# Altium footprint library Phoenix.PcbLib: 54 footprints (part 2 of 4)
Each footprint in its own frame and in the unit in brackets; x right, y up, seen from the top. Pads: shape width x height; smd on the part's side, far side on the other; paste and mask are expansions set on the pad; w line width, h text height; cw(c..) or ccw(c..) is an arc to the next point about the centre after c.
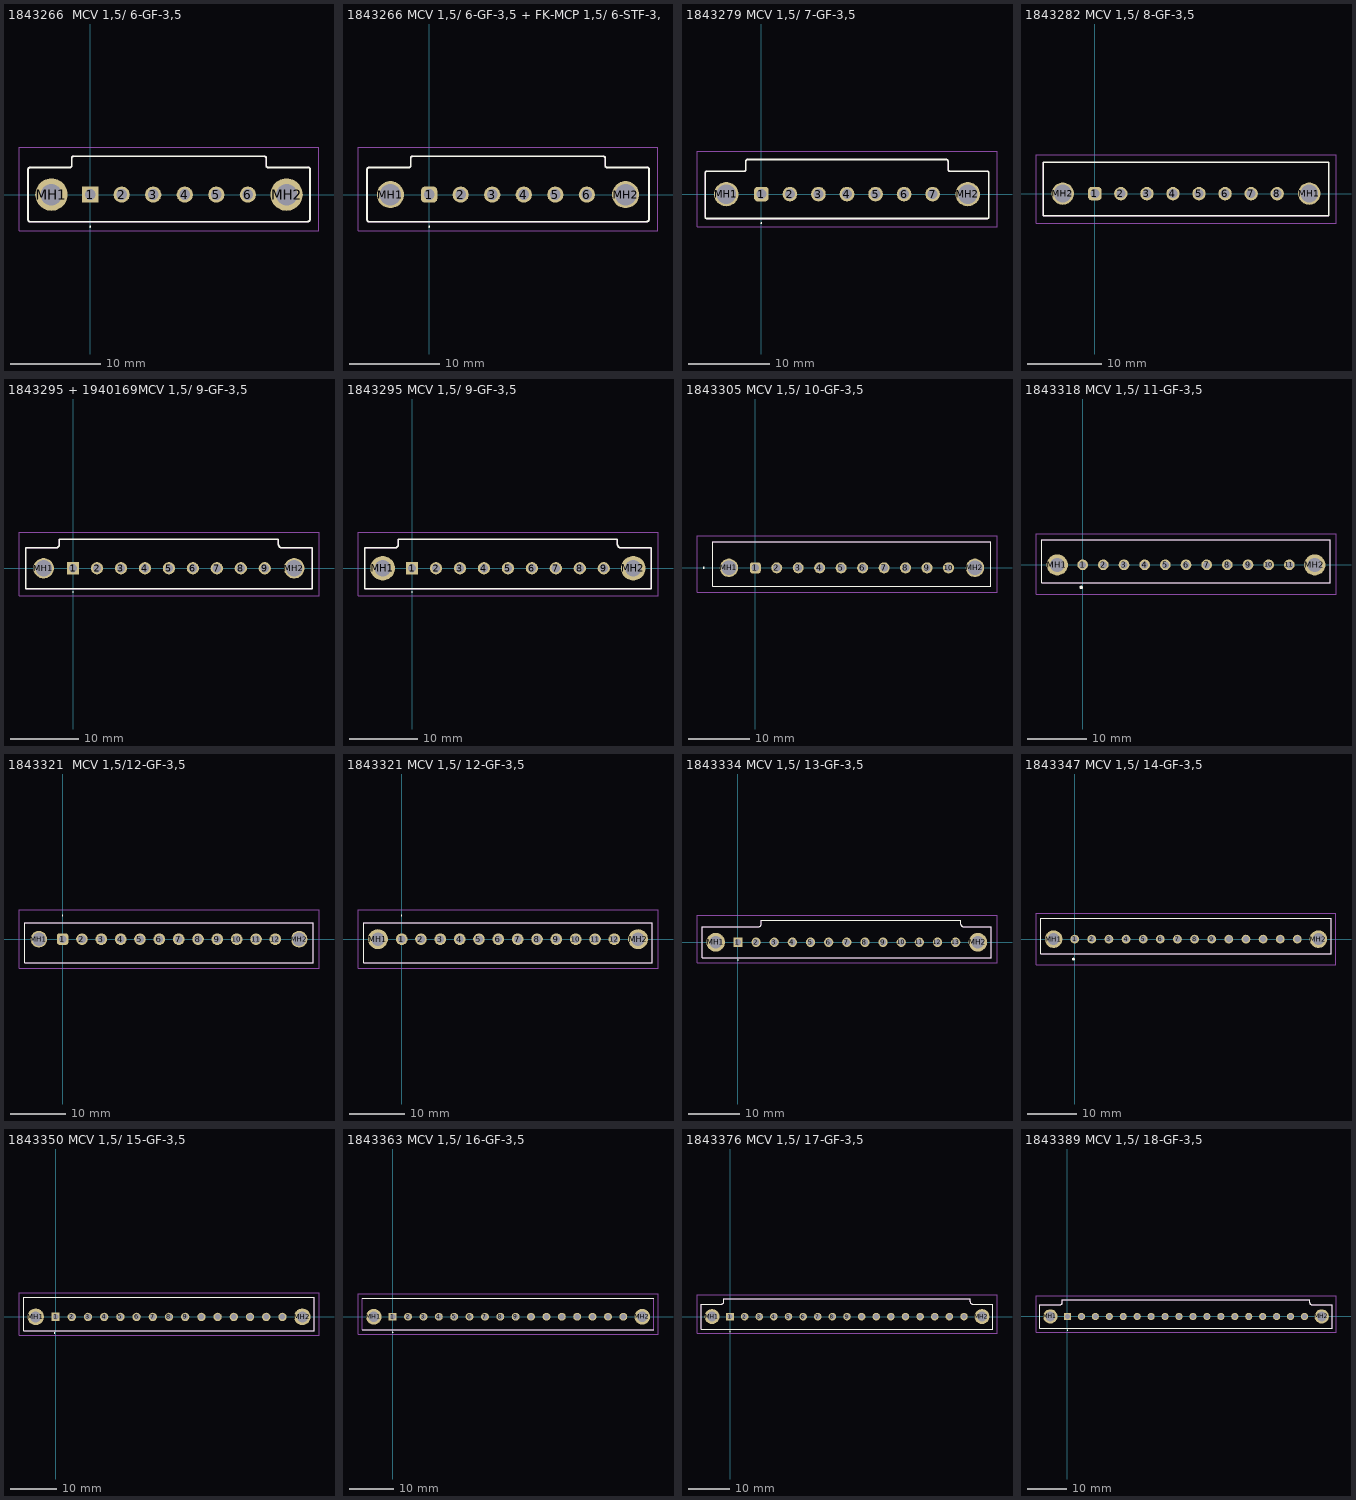
[diagram p1: the footprints below, top view; thin cyan lines are the x and y axes]

## 1843266  MCV 1,5/ 6-GF-3,5 [mm]
pads (8):
  rect 1.8x1.8 hole 1.2: 1(0,0)
  round 1.8 hole 1.2: 2(3.5,0) 3(7,0) 4(10.5,0) 5(14,0) 6(17.5,0)
  round 3.6 hole 2.4: MH1(-4.3,0) MH2(21.8,0)
Top Overlay:
  lines w0.1: 0,-3.6 cw(c0,-3.55) 0,-3.5 cw(c0,-3.55) 0,-3.6
  lines w0.2: -6.65,-3 cw(c-6.674,-2.775) -6.9,-2.775 -6.9,0.025 -6.9,2.825 cw(c-6.652,2.77) -6.65,3.025 -2.25,3 ; -6.65,-3 24.15,-3 ccw(c24.151,-2.749) 24.401,-2.775 24.4,2.825 ; -2.25,3 ccw(c-2.276,3.225) -2.049,3.225 ; -2.05,3.225 -2.05,4.025 cw(c-1.85,4.049) -1.85,4.25 ; -1.85,4.25 19.35,4.25 ; 19.35,4.25 cw(c19.324,4.025) 19.551,4.025 19.55,3.225 ccw(c19.75,3.201) 19.75,3 ; 19.75,3 24.15,3 ; 24.149,3 cw(c24.213,2.825) 24.399,2.825
Mechanical 13:
  lines w0.1: -6.9,2.825 -6.9,0.025 -6.9,-2.775 ccw(c-6.674,-2.775) -6.65,-3 ; -6.9,2.825 cw(c-6.65,2.769) -6.65,3.025 -2.25,3.025 ccw(c-2.25,3.225) -2.05,3.225 -2.05,4.025 cw(c-1.85,4.049) -1.85,4.25 ; -6.65,-3 24.15,-3 ccw(c24.151,-2.749) 24.401,-2.775 24.4,2.825 ccw(c24.195,2.825) 24.15,3.025 19.75,3 cw(c19.748,3.2) 19.55,3.225 ; -1.85,4.25 19.35,4.25 ; 19.35,4.25 cw(c19.324,4.025) 19.551,4.025 19.55,3.225
Mechanical 15:
  lines w0.1: -7.9,-4.001 -7.9,5.25 25.4,5.25 25.4,-4.001 -7.9,-4.001
3D body "1843266.stp": height 9.75, standoff -2.85, extent -6.9,-3 24.4,4.25

## 1843266 MCV 1,5/ 6-GF-3,5 + FK-MCP 1,5/ 6-STF-3,5 [mm]
pads (8):
  rrect50% 1.8x1.8 hole 1.2: 1(0,0)
  round 1.8 hole 1.2: 2(3.5,0) 3(7,0) 4(10.5,0) 5(14,0) 6(17.5,0)
  round 3 / inner round 2.4 / far side round 5 hole 2.4 unplated: MH1(-4.3,0) MH2(21.8,0)
Top Overlay:
  lines w0.1: 0,-3.6 ccw(c0,-3.55) 0,-3.5 ccw(c0,-3.55) 0,-3.6
  lines w0.2: -6.65,-3 cw(c-6.674,-2.775) -6.9,-2.775 -6.9,0.025 -6.9,2.825 cw(c-6.652,2.77) -6.65,3.025 -2.25,3 ; -6.65,-3 24.15,-3 ccw(c24.151,-2.749) 24.401,-2.775 24.4,2.825 ; -2.25,3 ccw(c-2.276,3.225) -2.049,3.225 ; -2.05,3.225 -2.05,4.025 cw(c-1.85,4.049) -1.85,4.25 ; -1.85,4.25 19.35,4.25 ; 19.35,4.25 cw(c19.324,4.025) 19.551,4.025 19.55,3.225 ccw(c19.75,3.201) 19.75,3 ; 19.75,3 24.15,3 ; 24.149,3 cw(c24.213,2.825) 24.399,2.825
Mechanical 13:
  lines w0.1: -6.9,2.825 -6.9,0.025 -6.9,-2.775 ccw(c-6.674,-2.775) -6.65,-3 ; -6.9,2.825 cw(c-6.65,2.769) -6.65,3.025 -2.05,3.025 -2.05,4.025 cw(c-1.85,4.049) -1.85,4.25 ; -6.65,-3 24.15,-3 ccw(c24.151,-2.749) 24.401,-2.775 24.4,2.825 ccw(c24.195,2.825) 24.15,3.025 19.75,3 cw(c19.748,3.2) 19.55,3.225 ; -1.85,4.25 19.35,4.25 ; 19.35,4.25 cw(c19.324,4.025) 19.551,4.025 19.55,3.225
Mechanical 15:
  lines w0.1: -7.9,-4.001 25.4,-4.001 25.4,5.25 -7.9,5.25 -7.9,-4.001
3D body "Wuerth_5051022045_ISO_7049_Stahl_verzinkt_Linsenkopf_Z_Form_C.stp": height 2.9, standoff -3.2, extent -6.3,-2 -2.3,2
3D body "Wuerth_5051022045_ISO_7049_Stahl_verzinkt_Linsenkopf_Z_Form_C.stp": height 2.9, standoff -3.2, extent 19.8,-2 23.8,2
3D body "1940130.stp": height 32.2, standoff 11.4, extent -6.9,-6.8 24.4,5.6
3D body "1843266.stp": height 9.25, standoff -3.35, extent -6.9,-3 24.4,4.25

## 1843279 MCV 1,5/ 7-GF-3,5 [mm]
pads (9):
  rrect50% 1.8x1.8 hole 1.2: 1(0,0)
  round 1.8 hole 1.2: 2(3.5,0) 3(7,0) 4(10.5,0) 5(14,0) 6(17.5,0) 7(21,0)
  round 3 / inner round 3.6 / far side round 5 hole 2.4: MH1(-4.3,0) MH2(25.3,0)
Top Overlay:
  lines w0.1: 0,-3.6 ccw(c0,-3.55) 0,-3.5 ccw(c0,-3.55) 0,-3.6
  lines w0.2: 22.699,4.25 cw(c22.643,4) 22.899,4 22.9,3 ccw(c23.1,3) 23.1,2.8 27.7,2.8 cw(c27.7,2.6) 27.9,2.6 27.9,-2.8 cw(c27.7,-2.8) 27.7,-3 -6.7,-3 cw(c-6.7,-2.8) -6.9,-2.8 -6.9,0.2 -6.9,2.6 cw(c-6.7,2.6) -6.7,2.8 -2.1,2.8 ccw(c-2.1,3) -1.9,3 -1.9,4 cw(c-1.7,4.045) -1.7,4.25 22.7,4.25
Mechanical 13:
  lines w0.1: 22.699,4.25 cw(c22.643,4) 22.899,4 22.9,3 ccw(c23.1,3) 23.1,2.8 27.7,2.8 cw(c27.7,2.6) 27.9,2.6 27.9,-2.8 cw(c27.7,-2.8) 27.7,-3 -6.7,-3 cw(c-6.7,-2.8) -6.9,-2.8 -6.9,0.2 -6.9,2.6 cw(c-6.7,2.6) -6.7,2.8 -2.1,2.8 ccw(c-2.1,3) -1.9,3 -1.9,4 cw(c-1.7,4.045) -1.7,4.25 22.7,4.25
Mechanical 15:
  lines w0.1: -7.9,-4 28.9,-4 28.9,5.25 -7.9,5.25 -7.9,-4
3D body "Wuerth_5051022045_ISO_7049_Stahl_verzinkt_Linsenkopf_Z_Form_C.stp": height 2.9, standoff -3.2, extent 23.3,-2 27.3,2
3D body "Wuerth_5051022045_ISO_7049_Stahl_verzinkt_Linsenkopf_Z_Form_C.stp": height 2.9, standoff -3.2, extent -6.3,-2 -2.3,2
3D body "1940143.stp": height 32.2, standoff 11.4, extent -6.9,-6.7 27.9,5.7
3D body "1843279.stp": height 9.75, standoff -2.85, extent -6.9,-3 27.9,4.25

## 1843282 MCV 1,5/ 8-GF-3,5 [mm]
pads (10):
  rrect50% 1.8x1.8 hole 1.2: 1(0,0)
  round 1.8 hole 1.2: 2(3.5,0) 3(7,0) 4(10.5,0) 5(14,0) 6(17.5,0) 7(21,0) 8(24.5,0)
  round 3 / inner round 3.6 / far side round 5 hole 2.4: MH1(28.8,0) MH2(-4.3,0)
Top Overlay:
  lines w0.2: -6.9,-3 -6.9,4.25 31.4,4.25 31.4,-3 -6.9,-3
Mechanical 13:
  lines w0.1: -6.9,-3 -6.9,4.25 31.4,4.25 31.4,-3 -6.9,-3
Mechanical 15:
  lines w0.1: -7.9,-4 -7.9,5.25 32.4,5.25 32.4,-4 -7.9,-4
3D body "Wuerth_5051022045_ISO_7049_Stahl_verzinkt_Linsenkopf_Z_Form_C.stp": height 2.9, standoff -3.2, extent -6.3,-1.989 -2.3,1.989
3D body "Wuerth_5051022045_ISO_7049_Stahl_verzinkt_Linsenkopf_Z_Form_C.stp": height 2.9, standoff -3.2, extent 26.8,-1.989 30.8,1.989
3D body "pxc_1940156_04_FK-MCP-1-5-8-STF-3-5_3D.stp": height 32.2, standoff 11.4, extent -6.9,-6.8 31.4,5.6
3D body "1843282.stp": height 9.72, standoff -2.88, extent -6.9,-3 31.4,4.25

## 1843295 + 1940169MCV 1,5/ 9-GF-3,5 [mm]
pads (11):
  rect 1.8x1.8 hole 1.2: 1(0,0)
  round 1.8 hole 1.2: 2(3.5,0) 3(7,0) 4(10.5,0) 5(14,0) 6(17.5,0) 7(21,0) 8(24.5,0) 9(28,0)
  round 3 / inner round 3.6 / far side round 5 hole 2.4: MH1(-4.3,0) MH2(32.3,0)
Top Overlay:
  lines w0.1: 0,-3.5 cw(c0,-3.45) 0,-3.4 cw(c0,-3.45) 0,-3.5
  lines w0.2: -6.9,-3 -6.9,3 -2.5,3 ccw(c-2.5,3.5) -2,3.5 -2,4.25 30,4.25 30,3.5 ccw(c30.5,3.5) 30.5,3 34.925,3 34.925,-3 -6.9,-3
Mechanical 13:
  lines w0.1: -6.9,-3 -6.9,3 -2.5,3 ccw(c-2.5,3.5) -2,3.5 -2,4.25 30,4.25 30,3.5 ccw(c30.5,3.5) 30.5,3 34.925,3 34.925,-3 -6.9,-3
Mechanical 15:
  lines w0.1: -7.9,-4 35.925,-4 35.925,5.25 -7.9,5.25 -7.9,-4
3D body "1940169.stp": height 32.2, standoff 11.4, extent -6.9,-6.8 34.9,5.6
3D body "1843295.stp": height 9.67, standoff -2.93, extent -6.8,-3 35,4.25
3D body "Wuerth_5051022045_ISO_7049_Stahl_verzinkt_Linsenkopf_Z_Form_C.stp": height 2.9, standoff -3.2, extent -6.3,-1.989 -2.3,1.989
3D body "Wuerth_5051022045_ISO_7049_Stahl_verzinkt_Linsenkopf_Z_Form_C.stp": height 2.9, standoff -3.2, extent 30.3,-1.989 34.3,1.989

## 1843295 MCV 1,5/ 9-GF-3,5 [mm]
pads (11):
  rect 1.8x1.8 hole 1.2: 1(0,0)
  round 1.8 hole 1.2: 2(3.5,0) 3(7,0) 4(10.5,0) 5(14,0) 6(17.5,0) 7(21,0) 8(24.5,0) 9(28,0)
  round 3.6 hole 2.4: MH1(-4.3,0) MH2(32.3,0)
Top Overlay:
  lines w0.1: 0,-3.5 ccw(c0,-3.45) 0,-3.4 ccw(c0,-3.45) 0,-3.5
  lines w0.2: -6.9,-3 34.925,-3 34.925,3 30.5,3 cw(c30.5,3.5) 30,3.5 30,4.25 -2,4.25 -2,3.5 cw(c-2.5,3.5) -2.5,3 -6.9,3 -6.9,-3
Mechanical 13:
  lines w0.1: -6.9,-3 34.925,-3 34.925,3 30.5,3 cw(c30.5,3.5) 30,3.5 30,4.25 -2,4.25 -2,3.5 cw(c-2.5,3.5) -2.5,3 -6.9,3 -6.9,-3
Mechanical 15:
  lines w0.1: -7.9,-4 -7.9,5.25 35.925,5.25 35.925,-4 -7.9,-4
3D body "1843295.stp": height 9.67, standoff -2.93, extent -6.8,-3 35,4.25

## 1843305 MCV 1,5/ 10-GF-3,5 [mm]
pads (12):
  rrect50% 1.8x1.8 hole 1.2: 1(0,0)
  round 1.8 hole 1.2: 2(3.5,0) 3(7,0) 4(10.5,0) 5(14,0) 6(17.5,0) 7(21,0) 8(24.5,0) 9(28,0) 10(31.5,0)
  round 3 / inner round 3.6 / far side round 5 hole 2.4: MH1(-4.3,0) MH2(35.8,0)
Top Overlay:
  lines w0.1: -6.9,-3 -6.9,4.25 38.4,4.25 38.4,-3 -6.9,-3
  lines w0.2: -8.5,0 cw(c-8.4,0) -8.3,0 cw(c-8.4,0) -8.5,0
Mechanical 13:
  lines w0.2: -6.9,-3 -6.9,4.25 38.4,4.25 38.4,-3 -6.9,-3
Mechanical 15:
  lines w0.1: -9.5,-4 -9.5,5.25 39.4,5.25 39.4,-4 -9.5,-4
3D body "Wuerth_5051022045_ISO_7049_Stahl_verzinkt_Linsenkopf_Z_Form_C.stp": height 2.9, standoff -3.2, extent 33.8,-2 37.8,2
3D body "Wuerth_5051022045_ISO_7049_Stahl_verzinkt_Linsenkopf_Z_Form_C.stp": height 2.9, standoff -3.2, extent -6.3,-2 -2.3,2
3D body "1843305.stp": height 9.68, standoff -2.92, extent -6.8,-3 38.5,4.25
3D body "1940172.stp": height 32.2, standoff 11.4, extent -6.85,-6.6 38.45,5.8

## 1843318 MCV 1,5/ 11-GF-3,5 [mm]
pads (13):
  round 1.8 hole 1.2: 1(0,0) 2(3.5,0) 3(7,0) 4(10.5,0) 5(14,0) 6(17.5,0) 7(21,0) 8(24.5,0) 9(28,0) 10(31.5,0) 11(35,0)
  round 3.6 hole 2.4: MH1(-4.3,0) MH2(39.3,0)
Top Overlay:
  lines w0.1: -6.9,-3 -6.9,4.25 41.9,4.25 41.9,-3 -6.9,-3
  lines w0.3: -0.4,-3.8 cw(c-0.25,-3.8) -0.1,-3.8 cw(c-0.25,-3.8) -0.4,-3.8
Mechanical 13:
  lines w0.2: -6.9,-3 -6.9,4.25 41.9,4.25 41.9,-3 -6.9,-3
Mechanical 15:
  lines w0.1: -7.9,-4.95 -7.9,5.25 42.9,5.25 42.9,-4.95 -7.9,-4.95
3D body "1843318.stp": height 9.73, standoff -2.87, extent -6.9,-2.98 41.9,4.27

## 1843321  MCV 1,5/12-GF-3,5 [mm]
pads (14):
  rrect50% 2.1x2.1 hole 1.4: 1(0,0)
  round 2.1 hole 1.4: 2(3.5,0) 3(7,0) 4(10.5,0) 5(14,0) 6(17.5,0) 7(21,0) 8(24.5,0) 9(28,0) 10(31.5,0) 11(35,0) 12(38.5,0)
  round 3 / inner round 2.4 / far side round 5 hole 2.4 unplated: MH1(-4.3,0) MH2(42.8,0)
Top Overlay:
  lines w0.1: -6.9,-4.25 45.4,-4.25 45.4,3 -6.9,3 -6.9,-4.25
  lines w0.2: 0,4.2 cw(c0,4.25) 0,4.3 ; 0,4.2 ccw(c0,4.25) 0,4.3 ; 0,4.2 cw(c0,4.25) 0,4.3
Mechanical 13:
  lines w0.2: -6.9,-4.25 45.4,-4.25 45.4,3 -6.9,3 -6.9,-4.25
Mechanical 15:
  lines w0.1: -7.9,-5.25 46.4,-5.25 46.4,5.3 -7.9,5.3 -7.9,-5.25
3D body "1940198.stp": height 32.2, standoff 11.4, extent -6.9,-6.8 45.4,5.6
3D body "1843321.stp": height 9.25, standoff -3.35, extent -6.9,-2.9 45.4,4.35
3D body "Wuerth_5051022045_ISO_7049_Stahl_verzinkt_Linsenkopf_Z_Form_C.stp": height 2.9, standoff -3.2, extent -6.3,-2 -2.3,2
3D body "Wuerth_5051022045_ISO_7049_Stahl_verzinkt_Linsenkopf_Z_Form_C.stp": height 2.9, standoff -3.2, extent 40.8,-2 44.8,2

## 1843321 MCV 1,5/ 12-GF-3,5 [mm]
pads (14):
  round 2.1 hole 1.4: 1(0,0) 2(3.5,0) 3(7,0) 4(10.5,0) 5(14,0) 6(17.5,0) 7(21,0) 8(24.5,0) 9(28,0) 10(31.5,0) 11(35,0) 12(38.5,0)
  round 3.6 hole 2.4: MH1(-4.3,0) MH2(42.8,0)
Top Overlay:
  lines w0.1: -6.9,-4.25 45.4,-4.25 45.4,3 -6.9,3 -6.9,-4.25
  lines w0.2: 0,4.2 cw(c0,4.25) 0,4.3 ; 0,4.2 ccw(c0,4.25) 0,4.3 ; 0,4.2 cw(c0,4.25) 0,4.3
Mechanical 13:
  lines w0.2: -6.9,-4.25 45.4,-4.25 45.4,3 -6.9,3 -6.9,-4.25
Mechanical 15:
  lines w0.1: -7.9,-5.25 46.4,-5.25 46.4,5.3 -7.9,5.3 -7.9,-5.25
3D body "1843321.stp": height 10.43, standoff -2.17, extent -6.9,-2.9 45.4,4.35

## 1843334 MCV 1,5/ 13-GF-3,5 [mm]
pads (15):
  rect 1.8x1.8 hole 1.2: 1(0,0)
  round 1.8 hole 1.2: 2(3.5,0) 3(7,0) 4(10.5,0) 5(14,0) 6(17.5,0) 7(21,0) 8(24.5,0) 9(28,0) 10(31.5,0) 11(35,0) 12(38.5,0) 13(42,0)
  round 3.6 hole 2.4: MH1(-4.3,0) MH2(46.3,0)
Top Overlay:
  lines w0.1: 0,-3.5 ccw(c0,-3.45) 0,-3.4 ccw(c0,-3.45) 0,-3.5
  lines w0.2: -6.9,-3 48.9,-3 48.9,3 43.5,3 cw(c43.5,3.5) 43,3.5 43,4.25 4.5,4.25 4.5,3.5 cw(c4,3.5) 4,3 -6.9,3 -6.9,-3
Mechanical 13:
  lines w0.1: -6.9,-3 48.9,-3 48.9,3 43.5,3 cw(c43.5,3.5) 43,3.5 43,4.25 4.5,4.25 4.5,3.5 cw(c4,3.5) 4,3 -6.9,3 -6.9,-3
Mechanical 15:
  lines w0.1: -7.9,-4 -7.9,5.25 49.98,5.25 49.98,-4 -7.9,-4
3D body "1843334.stp": height 9.71, standoff -2.89, extent -6.86,-3 48.94,4.25

## 1843347 MCV 1,5/ 14-GF-3,5 [mm]
pads (16):
  round 1.8 hole 1.2: 1(0,0) 2(3.5,0) 3(7,0) 4(10.5,0) 5(14,0) 6(17.5,0) 7(21,0) 8(24.5,0) 9(28,0) 10(31.5,0) 11(35,0) 12(38.5,0) 13(42,0) 14(45.5,0)
  round 3.6 hole 2.4: MH1(-4.3,0) MH2(49.8,0)
Top Overlay:
  lines w0.1: -6.9,-3 52.4,-3 52.4,4.25 -6.9,4.25 -6.9,-3
  lines w0.4: -0.25,-4.2 cw(c-0.25,-4.1) -0.25,-4 cw(c-0.25,-4.1) -0.25,-4.2
Mechanical 13:
  lines w0.2: -6.9,-3 52.4,-3 52.4,4.25 -6.9,4.25 -6.9,-3
Mechanical 15:
  lines w0.1: -7.9,-5.2 53.4,-5.2 53.4,5.25 -7.9,5.25 -7.9,-5.2
3D body "1843347.stp": height 9.75, standoff -2.85, extent -6.9,-4.16 52.4,3.09

## 1843350 MCV 1,5/ 15-GF-3,5 [mm]
pads (17):
  rect 1.8x1.8 hole 1.2: 1(0,0)
  round 1.8 hole 1.2: 2(3.5,0) 3(7,0) 4(10.5,0) 5(14,0) 6(17.5,0) 7(21,0) 8(24.5,0) 9(28,0) 10(31.5,0) 11(35,0) 12(38.5,0) 13(42,0) 14(45.5,0) 15(49,0)
  round 3.6 hole 2.4: MH1(-4.3,0) MH2(53.3,0)
Top Overlay:
  lines w0.1: -0.2,-3.5 cw(c-0.2,-3.45) -0.2,-3.4 cw(c-0.2,-3.45) -0.2,-3.5
  lines w0.2: -6.9,-3 55.9,-3 55.9,4.25 -6.9,4.25 -6.9,-3
Mechanical 13:
  lines w0.1: -6.9,-3 55.9,-3 55.9,4.25 -6.9,4.25 -6.9,-3
Mechanical 15:
  lines w0.1: -7.9,-4 56.9,-4 56.9,5.25 -7.9,5.25 -7.9,-4
3D body "1843350.stp": height 9.72, standoff -2.88, extent -6.9,-4.28 55.9,2.97

## 1843363 MCV 1,5/ 16-GF-3,5 [mm]
pads (18):
  rect 1.8x1.8 hole 1.2: 1(0,0)
  round 1.8 hole 1.2: 2(3.5,0) 3(7,0) 4(10.5,0) 5(14,0) 6(17.5,0) 7(21,0) 8(24.5,0) 9(28,0) 10(31.5,0) 11(35,0) 12(38.5,0) 13(42,0) 14(45.5,0) 15(49,0) 16(52.5,0)
  round 3.6 hole 2.4: MH1(-4.3,0) MH2(56.8,0)
Top Overlay:
  lines w0.1: 0,-3.6 cw(c0,-3.55) 0,-3.5 cw(c0,-3.55) 0,-3.6
  lines w0.2: -6.9,-3 59.4,-3 ; -6.9,4.25 59.4,4.25
Mechanical 13:
  lines w0.1: -6.9,-3 -6.9,4.25 59.4,4.25 59.4,-3 -6.9,-3
Mechanical 15:
  lines w0.1: -7.9,-4 -7.9,5.25 60.4,5.25 60.4,-4 -7.9,-4
3D body "1843363.stp": height 9.72, standoff -2.88, extent -6.9,-4.27 59.4,2.98

## 1843376 MCV 1,5/ 17-GF-3,5 [mm]
pads (19):
  rect 1.8x1.8 hole 1.2: 1(0,0)
  round 1.8 hole 1.2: 2(3.5,0) 3(7,0) 4(10.5,0) 5(14,0) 6(17.5,0) 7(21,0) 8(24.5,0) 9(28,0) 10(31.5,0) 11(35,0) 12(38.5,0) 13(42,0) 14(45.5,0) 15(49,0) 16(52.5,0) 17(56,0)
  round 3.6 hole 2.4: MH1(-4.3,0) MH2(60.3,0)
Top Overlay:
  lines w0.1: 0,-3.6 ccw(c0,-3.55) 0,-3.5 ccw(c0,-3.55) 0,-3.6
  lines w0.2: -6.9,-3 -6.9,3 -2,3 ccw(c-2,3.5) -1.5,3.5 -1.5,4.25 57.5,4.25 57.5,3.5 ccw(c58,3.5) 58,3 62.9,3 62.9,-3 -6.9,-3
Mechanical 13:
  lines w0.1: -6.9,-3 -6.9,3 -2,3 ccw(c-2,3.5) -1.5,3.5 -1.5,4.25 57.5,4.25 57.5,3.5 ccw(c58,3.5) 58,3 62.9,3 62.9,-3 -6.9,-3
Mechanical 15:
  lines w0.1: -7.9,-4 63.9,-4 63.9,5.25 -7.9,5.25 -7.9,-4
3D body "1843376.stp": height 9.67, standoff -2.93, extent -6.9,-4.25 62.9,3

## 1843389 MCV 1,5/ 18-GF-3,5 [mm]
pads (20):
  rect 1.8x1.8 hole 1.2: 1(0,0)
  round 1.8 hole 1.2: 2(3.5,0) 3(7,0) 4(10.5,0) 5(14,0) 6(17.5,0) 7(21,0) 8(24.5,0) 9(28,0) 10(31.5,0) 11(35,0) 12(38.5,0) 13(42,0) 14(45.5,0) 15(49,0) 16(52.5,0) 17(56,0) 18(59.5,0)
  round 3.6 hole 2.4: MH1(-4.3,0) MH2(63.8,0)
Top Overlay:
  lines w0.1: 0,-3.5 ccw(c0,-3.45) 0,-3.4 ccw(c0,-3.45) 0,-3.5
  lines w0.2: -6.9,-3 66.4,-3 66.4,3 61.25,3 cw(c61.25,3.5) 60.75,3.5 60.75,4.25 -1.25,4.25 -1.25,3.5 cw(c-1.75,3.5) -1.75,3 -6.9,3 -6.9,-3
Mechanical 13:
  lines w0.1: -6.9,-3 66.4,-3 66.4,3 61.25,3 cw(c61.25,3.5) 60.75,3.5 60.75,4.25 -1.25,4.25 -1.25,3.5 cw(c-1.75,3.5) -1.75,3 -6.9,3 -6.9,-3
Mechanical 15:
  lines w0.1: -7.9,-4 -7.9,5.25 67.4,5.25 67.4,-4 -7.9,-4
3D body "1843389.stp": height 10.23, standoff -2.37, extent -7.02,-3 66.28,4.25